# Altium footprint library devices.PCBLIB: 335 footprints (part 21 of 21)
Each footprint in its own frame and in the unit in brackets; x right, y up, seen from the top. Pads: shape width x height; smd on the part's side, far side on the other; paste and mask are expansions set on the pad; w line width, h text height; cw(c..) or ccw(c..) is an arc to the next point about the centre after c.
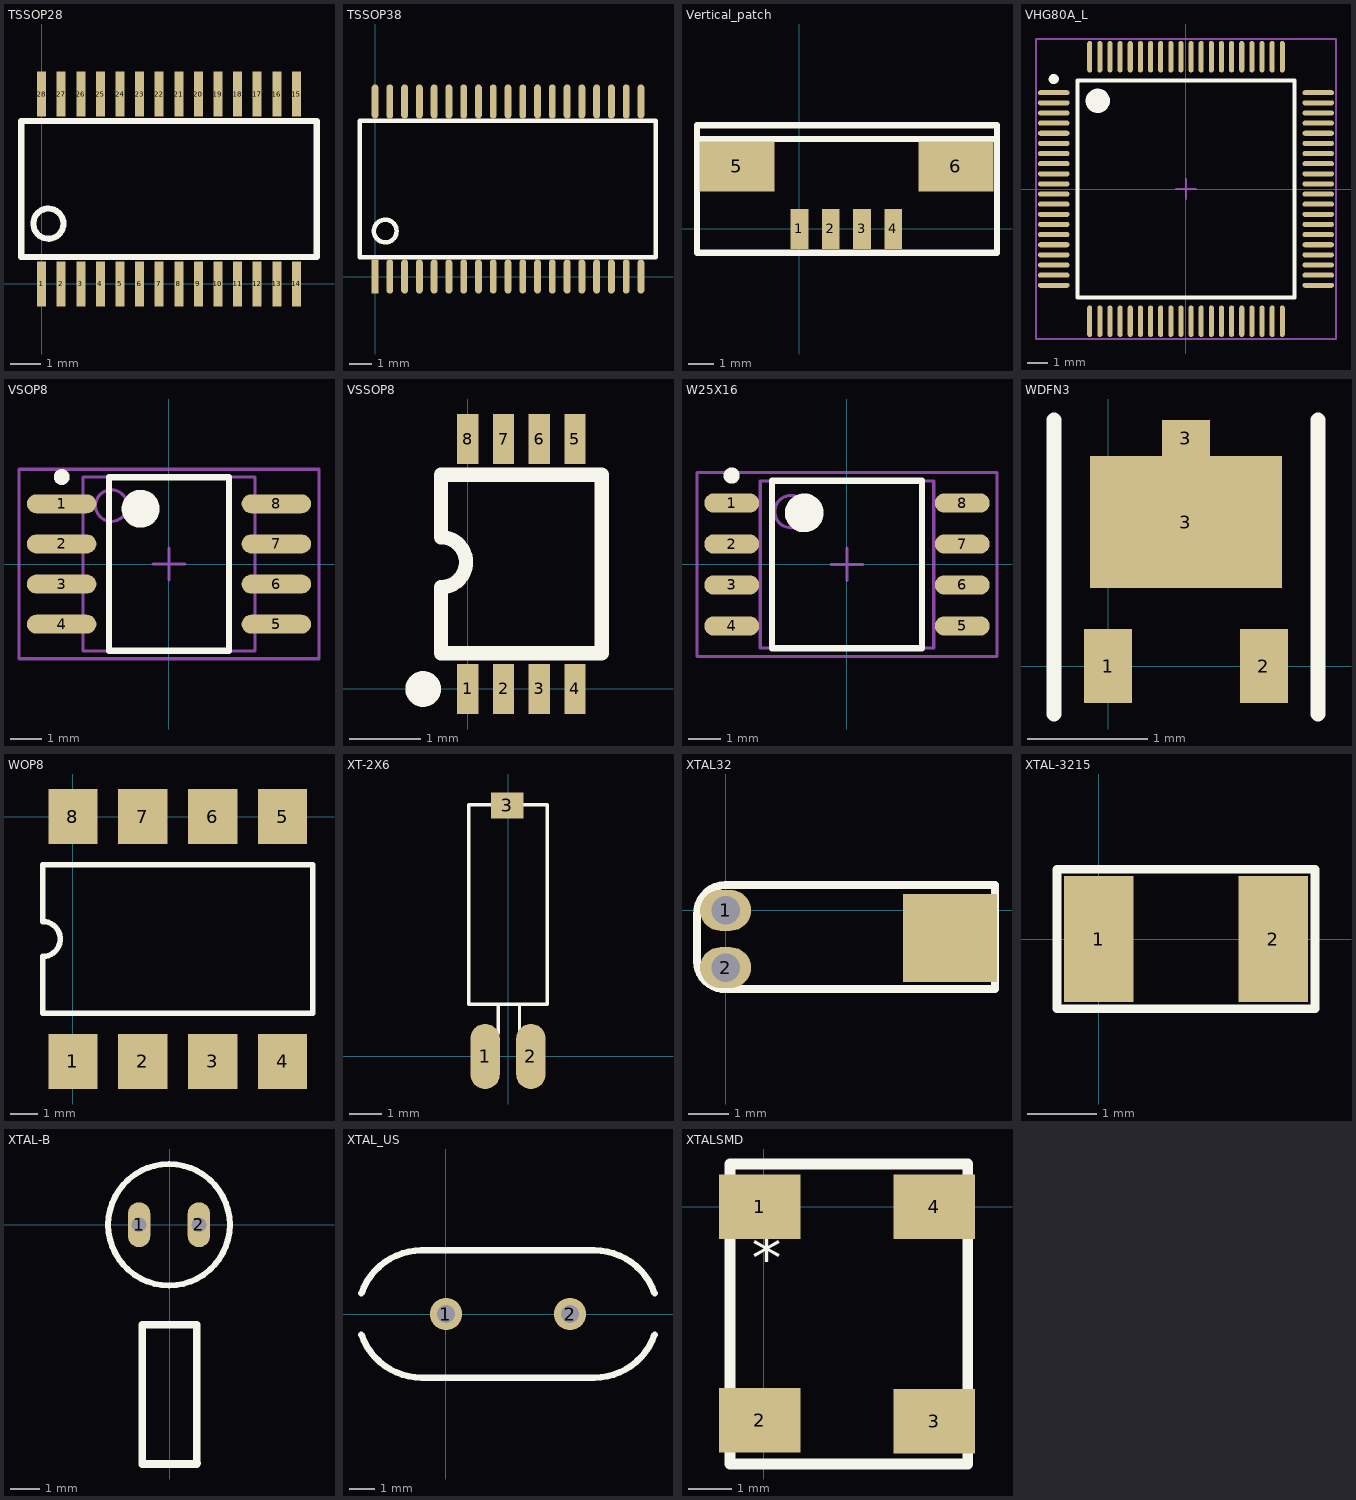
[diagram p20: the footprints below, top view; thin cyan lines are the x and y axes]

## TSSOP28 [mm]
pads (28):
  rect 0.3x1.5 smd: 1(0,0) 2(0.65,0) 3(1.3,0) 4(1.95,0) 5(2.6,0) 6(3.25,0) 7(3.9,0) 8(4.55,0) 9(5.2,0) 10(5.85,0) 11(6.5,0) 12(7.15,0) 13(7.8,0) 14(8.45,0) 15(8.45,6.3) 16(7.8,6.3) 17(7.15,6.3) 18(6.5,6.3) 19(5.85,6.3) 20(5.2,6.3) 21(4.55,6.3) 22(3.9,6.3) 23(3.25,6.3) 24(2.6,6.3) 25(1.95,6.3) 26(1.3,6.3) 27(0.65,6.3) 28(0,6.3)
Top Overlay:
  circle w0.2: c0.225,2 r0.5
  lines w0.2: -0.675,0.9 -0.675,5.4 9.125,5.4 9.125,0.9 -0.675,0.9

## TSSOP38 [mm]
pads (38):
  rect 0.3x1.5 smd: 1(0,0)
  oval 0.3x1.5 smd: 2(0.65,0) 3(1.3,0) 4(1.95,0) 5(2.6,0) 6(3.25,0) 7(3.9,0) 8(4.55,0) 9(5.2,0) 10(5.85,0) 11(6.5,0) 12(7.15,0) 13(7.8,0) 14(8.45,0) 15(9.1,0) 16(9.75,0) 17(10.4,0) 18(11.05,0) 19(11.7,0) 20(11.7,7.7) 21(11.05,7.7) 22(10.4,7.7) 23(9.75,7.7) 24(9.1,7.7) 25(8.45,7.7) 26(7.8,7.7) 27(7.15,7.7) 28(6.5,7.7) 29(5.85,7.7) 30(5.2,7.7) 31(4.55,7.7) 32(3.9,7.7) 33(3.25,7.7) 34(2.6,7.7) 35(1.95,7.7) 36(1.3,7.7) 37(0.65,7.7) 38(0,7.7)
Top Overlay:
  circle w0.2: c0.45,2 r0.5
  lines w0.2: -0.675,0.85 -0.675,6.85 12.35,6.85 12.35,0.85 -0.675,0.85

## Vertical_patch [mm]
pads (6):
  rect 0.7x1.6 smd: 1(0,0) 2(1.25,0) 3(2.5,0) 4(3.75,0)
  rect 3x2 smd: 5(-2.5,2.5) 6(6.25,2.5)
Top Overlay:
  lines w0.254: 4.7,3.6 7.9,3.6 ; -4.1,3.6 -0.95,3.6 7.9,3.6 ; -4.1,3.6 -4.1,-0.95 7.9,-0.95 7.9,3.6 ; -4.1,3.6 -4.1,4.15 7.9,4.15 7.9,3.6

## VHG80A_L [mm] "Thin QFP, 80-Leads, Body 12x12mm, Pitch 0.5mm, IPC High Density"
height 1.6
pads (80):
  oval 1.55x0.25 smd: 1(-6.525,4.75) 2(-6.525,4.25) 3(-6.525,3.75) 4(-6.525,3.25) 5(-6.525,2.75) 6(-6.525,2.25) 7(-6.525,1.75) 8(-6.525,1.25) 9(-6.525,0.75) 10(-6.525,0.25) 11(-6.525,-0.25) 12(-6.525,-0.75) 13(-6.525,-1.25) 14(-6.525,-1.75) 15(-6.525,-2.25) 16(-6.525,-2.75) 17(-6.525,-3.25) 18(-6.525,-3.75) 19(-6.525,-4.25) 20(-6.525,-4.75) 41(6.525,-4.75) 42(6.525,-4.25) 43(6.525,-3.75) 44(6.525,-3.25) 45(6.525,-2.75) 46(6.525,-2.25) 47(6.525,-1.75) 48(6.525,-1.25) 49(6.525,-0.75) 50(6.525,-0.25) 51(6.525,0.25) 52(6.525,0.75) 53(6.525,1.25) 54(6.525,1.75) 55(6.525,2.25) 56(6.525,2.75) 57(6.525,3.25) 58(6.525,3.75) 59(6.525,4.25) 60(6.525,4.75)
  oval 0.25x1.55 smd: 21(-4.75,-6.525) 22(-4.25,-6.525) 23(-3.75,-6.525) 24(-3.25,-6.525) 25(-2.75,-6.525) 26(-2.25,-6.525) 27(-1.75,-6.525) 28(-1.25,-6.525) 29(-0.75,-6.525) 30(-0.25,-6.525) 31(0.25,-6.525) 32(0.75,-6.525) 33(1.25,-6.525) 34(1.75,-6.525) 35(2.25,-6.525) 36(2.75,-6.525) 37(3.25,-6.525) 38(3.75,-6.525) 39(4.25,-6.525) 40(4.75,-6.525) 61(4.75,6.525) 62(4.25,6.525) 63(3.75,6.525) 64(3.25,6.525) 65(2.75,6.525) 66(2.25,6.525) 67(1.75,6.525) 68(1.25,6.525) 69(0.75,6.525) 70(0.25,6.525) 71(-0.25,6.525) 72(-0.75,6.525) 73(-1.25,6.525) 74(-1.75,6.525) 75(-2.25,6.525) 76(-2.75,6.525) 77(-3.25,6.525) 78(-3.75,6.525) 79(-4.25,6.525) 80(-4.75,6.525)
Top Overlay:
  circle w0.6: c-4.35,4.35 r0.3
  circle w0.25: c-6.525,5.425 r0.125
  lines w0.2: -5.35,-5.35 5.35,-5.35 5.35,5.35 -5.35,5.35 -5.35,-5.35
Mechanical 15:
  lines w0.1: -0.5,0 0.5,0 ; 0,-0.5 0,0.5 ; -7.4,-7.4 7.4,-7.4 7.4,7.4 -7.4,7.4 -7.4,-7.4

## VSOP8 [mm] "SOP, 8-Leads, Body 5.3x5.3mm, Pitch 1.27mm, IPC Medium Density"
height 2.16
pads (8):
  oval 2.2x0.6 smd: 1(-3.4,1.905) 2(-3.4,0.635) 3(-3.4,-0.635) 4(-3.4,-1.905) 5(3.4,-1.905) 6(3.4,-0.635) 7(3.4,0.635) 8(3.4,1.905)
Top Overlay:
  circle w0.6: c-0.9,1.75 r0.3
  circle w0.25: c-3.4,2.755 r0.125
  lines w0.2: -1.9,-2.75 1.9,-2.75 1.9,2.75 -1.9,2.75 -1.9,-2.75
Mechanical 13:
  circle w0.1: c-1.825,1.85 r0.5
  lines w0.1: -2.725,-2.75 2.725,-2.75 2.725,2.75 -2.725,2.75 -2.725,-2.75
Mechanical 15:
  lines w0.1: -0.5,0 0.5,0 ; 0,-0.5 0,0.5 ; -4.75,-3 4.75,-3 4.75,3 -4.75,3 -4.75,-3
3D body: height 2.16, standoff 0, extent -2.725,-2.75 2.725,2.75

## VSSOP8 [mm] "Plastic SSOP; 8 Leads; Body Width 5.3 mm; Pitch 0.65 mm"
height 2
pads (8):
  rect 0.3x0.7 smd: 1(0,0) 2(0.5,0) 3(1,0) 4(1.5,0) 5(1.5,3.5) 6(1,3.5) 7(0.5,3.5) 8(0,3.5)
Top Overlay:
  circle w0.25: c-0.625,0 r0.125
  lines w0.2: -0.375,1.375 -0.375,0.5 1.875,0.5 1.875,3 -0.375,3 -0.375,2.125 cw(c-0.375,1.775) -0.375,1.425

## W25X16 [mm]
height 2.16
pads (8):
  oval 1.7x0.6 smd: 1(-3.575,1.905) 2(-3.575,0.635) 3(-3.575,-0.635) 4(-3.575,-1.905) 5(3.575,-1.905) 6(3.575,-0.635) 7(3.575,0.635) 8(3.575,1.905)
Top Overlay:
  circle w0.25: c-3.575,2.755 r0.125
  circle w0.6: c-1.325,1.6 r0.3
  lines w0.2: -2.325,-2.6 -2.325,2.6 2.325,2.6 2.325,-2.6 -2.325,-2.6
Mechanical 16:
  circle w0.1: c-1.74,1.64 r0.5
  lines w0.1: -0.5,0 0.5,0 ; 0,-0.5 0,0.5 ; -4.65,-2.85 -4.65,2.85 4.65,2.85 4.65,-2.85 -4.65,-2.85 ; -2.69,-2.59 -2.69,2.59 2.69,2.59 2.69,-2.59 -2.69,-2.59

## WDFN3 [mm]
pads (4):
  rect 0.4x0.62 smd: 1(0,0) 2(1.3,0)
  rect 1.6x1.1 smd: 3(0.65,1.2)
  rect 0.4x0.3 smd: 3(0.65,1.9)
Top Overlay:
  lines w0.127: -0.45,-0.4 -0.45,2.05 ; 1.75,-0.4 1.75,2.05

## WOP8 [mm] "Small Outline; 8 Leads; Body Width 3.9 mm; Pitch 1.27 mm"
height 1.75
pads (8):
  rect 1.78x2 smd: 1(0,-8.89) 2(2.54,-8.89) 3(5.08,-8.89) 4(7.62,-8.89) 5(7.62,0) 6(5.08,0) 7(2.54,0) 8(0,0)
Top Overlay:
  lines w0.2: -1.09,-7.145 -1.09,-5.08 ccw(c-1.09,-4.445) -1.09,-3.81 -1.09,-1.745 8.71,-1.745 8.71,-7.145 -1.09,-7.145

## XT-2X6 [mm]
pads (3):
  oval 0.9x2 smd: 1(-0.7,0) 2(0.7,0)
  rect 1x0.8 smd: 3(-0.021,7.7)
Top Overlay:
  lines w0.102: -0.3,0.7 -0.3,1.55 ; 0.35,0.7 0.35,1.6 ; -1.2,1.6 -1.2,7.712 1.2,7.712 1.2,1.6 -1.2,1.6

## XTAL32 [mil]
pads (3):
  oval 50x40 hole 28: 1(0,0) 2(0,-56)
  rect 92.13x86 smd: ""(220,-27)
Top Overlay:
  lines w8: -28,-50 ccw(c-0.5,-49.5) 0,-77 264,-77 264,25 0,25 ccw(c0.5,-3.5) -28,-4 -28,-50

## XTAL-3215 [mm]
height 6.86
pads (2):
  rect 1x1.8 smd: 1(0,0) 2(2.5,0)
Top Overlay:
  lines w0.127: -0.6,-1 -0.6,1 3.1,1 3.1,-1 -0.6,-1

## XTAL-B [mm]
pads (2):
  oval 0.75x1.5 hole 0.5: 1(-1.024,0.001) 2(0.976,0.001)
Top Overlay:
  circle w0.2: c-0.024,0.001 r2.032
  lines w0.254: 0.926,-7.974 0.901,-7.999 ; 0.901,-7.999 -0.924,-7.999 -0.924,-3.349 0.901,-3.349 0.901,-7.999

## XTAL_US [mil]
pads (2):
  round 50 hole 28: 1(0,0) 2(192.13,0)
Top Overlay:
  lines w10: -130.92,-31.85 ccw(c-37.79,0) -37.79,-98.42 ; -130.92,31.85 cw(c-37.79,0) -37.79,98.43 ; -38,98.42 229.92,98.43 cw(c229.92,0) 323.05,31.85 ; -37.8,-98.43 229.92,-98.42 ccw(c229.92,0) 323.05,-31.85

## XTALSMD [mm]
pads (4):
  rect 1.9x1.5 smd: 1(-0.102,0) 2(-0.102,-4.978) 3(3.97,-5) 4(3.97,0)
Top Overlay:
  lines w0.254: -0.791,-5.994 -0.791,0.991 4.747,0.991 4.747,-5.994 -0.791,-5.994
  text "*" at -0.279,-1.702 h1.02